# Altium footprint library standard-case.PcbLib: 221 footprints (part 7 of 14) (continued)
## 256-FBGA [mm] "pitch 1mm" (continued)
  round 0.5 on Mech1: ""(-7.9,7.9)
Top Overlay:
  circle w0.25: c-9,8.3 r0.125
  region: -7.5,8.5 -8.5,7.5 -8.5,8.5
  lines w0.2: -8.5,7.5 -7.5,8.5 ; -8.5,-8.5 -8.5,8.5 8.5,8.5 8.5,-8.5 -8.5,-8.5
Mechanical 1:
  lines w0.1: -8.525,-8.475 8.475,-8.475 8.475,8.525 -8.525,8.525 -8.525,-8.475
Mechanical 15:
  lines w0.1: -0.5,0 0.5,0 ; 0,-0.5 0,0.5 ; -9,-9 -9,9 9,9 9,-9 -9,-9
3D body "6666.STEP": height 2, standoff 0, extent -8.525,-8.475 8.475,8.525

## 448-LFBGA [mm]
pads (449):
  round 0.3 smd mask+0.05: A1(-8.4,8.4) A2(-7.6,8.4) A3(-6.8,8.4) A4(-6,8.4) A5(-5.2,8.4) A6(-4.4,8.4) A7(-3.6,8.4) A8(-2.8,8.4) A9(-2,8.4) A10(-1.2,8.4) A11(-0.4,8.4) A12(0.4,8.4) A13(1.2,8.4) A14(2,8.4) A15(2.8,8.4) A16(3.6,8.4) A17(4.4,8.4) A18(5.2,8.4) A19(6,8.4) A20(6.8,8.4) A21(7.6,8.4) A22(8.4,8.4) AA1(-8.4,-7.6) AA2(-7.6,-7.6) AA3(-6.8,-7.6) AA4(-6,-7.6) AA5(-5.2,-7.6) AA6(-4.4,-7.6) AA7(-3.6,-7.6) AA8(-2.8,-7.6) AA9(-2,-7.6) AA10(-1.2,-7.6) AA11(-0.4,-7.6) AA12(0.4,-7.6) AA13(1.2,-7.6) AA14(2,-7.6) AA15(2.8,-7.6) AA16(3.6,-7.6) AA17(4.4,-7.6) AA18(5.2,-7.6) AA19(6,-7.6) AA20(6.8,-7.6) AA21(7.6,-7.6) AA22(8.4,-7.6) AB1(-8.4,-8.4) AB2(-7.6,-8.4) AB3(-6.8,-8.4) AB4(-6,-8.4) AB5(-5.2,-8.4) AB6(-4.4,-8.4) AB7(-3.6,-8.4) AB8(-2.8,-8.4) AB9(-2,-8.4) AB10(-1.2,-8.4) AB11(-0.4,-8.4) AB12(0.4,-8.4) AB13(1.2,-8.4) AB14(2,-8.4) AB15(2.8,-8.4) AB16(3.6,-8.4) AB17(4.4,-8.4) AB18(5.2,-8.4) AB19(6,-8.4) AB20(6.8,-8.4) AB21(7.6,-8.4) AB22(8.4,-8.4) B1(-8.4,7.6) B2(-7.6,7.6) B3(-6.8,7.6) B4(-6,7.6) B5(-5.2,7.6) B6(-4.4,7.6) B7(-3.6,7.6) B8(-2.8,7.6) B9(-2,7.6) B10(-1.2,7.6) B11(-0.4,7.6) B12(0.4,7.6) B13(1.2,7.6) B14(2,7.6) B15(2.8,7.6) B16(3.6,7.6) B17(4.4,7.6) B18(5.2,7.6) B19(6,7.6) B20(6.8,7.6) B21(7.6,7.6) B22(8.4,7.6) C1(-8.4,6.8) C2(-7.6,6.8) C3(-6.8,6.8) C4(-6,6.8) C5(-5.2,6.8) C6(-4.4,6.8) C7(-3.6,6.8) C8(-2.8,6.8) C9(-2,6.8) C10(-1.2,6.8) C11(-0.4,6.8) C12(0.4,6.8) C13(1.2,6.8) C14(2,6.8) C15(2.8,6.8) C16(3.6,6.8) C17(4.4,6.8) C18(5.2,6.8) C19(6,6.8) C20(6.8,6.8) C21(7.6,6.8) C22(8.4,6.8) D1(-8.4,6) D2(-7.6,6) D3(-6.8,6) D4(-6,6) D5(-5.2,6) D6(-4.4,6) D7(-3.6,6) D8(-2.8,6) D9(-2,6) D10(-1.2,6) D11(-0.4,6) D12(0.4,6) D13(1.2,6) D14(2,6) D15(2.8,6) D16(3.6,6) D17(4.4,6) D18(5.2,6) D19(6,6) D20(6.8,6) D21(7.6,6) D22(8.4,6) E1(-8.4,5.2) E2(-7.6,5.2) E3(-6.8,5.2) E4(-6,5.2) E5(-5.2,5.2) E6(-4.4,5.2) E7(-3.6,5.2) E8(-2.8,5.2) E9(-2,5.2) E10(-1.2,5.2) E11(-0.4,5.2) E12(0.4,5.2) E13(1.2,5.2) E14(2,5.2) E15(2.8,5.2) E16(3.6,5.2) E17(4.4,5.2) E18(5.2,5.2) E19(6,5.2) E20(6.8,5.2) E21(7.6,5.2) E22(8.4,5.2) F1(-8.4,4.4) F2(-7.6,4.4) F3(-6.8,4.4) F4(-6,4.4) F5(-5.2,4.4) F6(-4.4,4.4) F7(-3.6,4.4) F8(-2.8,4.4) F9(-2,4.4) F10(-1.2,4.4) F11(-0.4,4.4) F12(0.4,4.4) F13(1.2,4.4) F14(2,4.4) F15(2.8,4.4) F16(3.6,4.4) F17(4.4,4.4) F18(5.2,4.4) F19(6,4.4) F20(6.8,4.4) F21(7.6,4.4) G1(-8.4,3.6) G2(-7.6,3.6) G3(-6.8,3.6) G4(-6,3.6) G5(-5.2,3.6) G6(-4.4,3.6) G8(-2.8,3.6) G10(-1.2,3.6) G12(0.4,3.6) G14(2,3.6) G16(3.6,3.6) G17(4.4,3.6) G18(5.2,3.6) G19(6,3.6) G20(6.8,3.6) G21(7.6,3.6) G22(8.4,3.6) H1(-8.4,2.8) H2(-7.6,2.8) H3(-6.8,2.8) H4(-6,2.8) H5(-5.2,2.8) H6(-4.4,2.8) H7(-3.6,2.8) H9(-2,2.8) H11(-0.4,2.8) H13(1.2,2.8) H15(2.8,2.8) H17(4.4,2.8) H18(5.2,2.8) H19(6,2.8) H20(6.8,2.8) H21(7.6,2.8) H22(8.4,2.8) J1(-8.4,2) J2(-7.6,2) J3(-6.8,2) J4(-6,2) J5(-5.2,2) J6(-4.4,2) J8(-2.8,2) J9(-2,2) J10(-1.2,2) J11(-0.4,2) J12(0.4,2) J13(1.2,2) J14(2,2) J16(3.6,2) J17(4.4,2) J18(5.2,2) J19(6,2) J20(6.8,2) J21(7.6,2) K1(-8.4,1.2) K2(-7.6,1.2) K3(-6.8,1.2) K4(-6,1.2) K5(-5.2,1.2) K6(-4.4,1.2) K7(-3.6,1.2) K9(-2,1.2) K10(-1.2,1.2) K11(-0.4,1.2) K12(0.4,1.2) K13(1.2,1.2) K14(2,1.2) K15(2.8,1.2) K17(4.4,1.2) K18(5.2,1.2) K19(6,1.2) K20(6.8,1.2) K21(7.6,1.2) K22(8.4,1.2) L1(-8.4,0.4) L2(-7.6,0.4) L3(-6.8,0.4) L4(-6,0.4) L5(-5.2,0.4) L6(-4.4,0.4) L8(-2.8,0.4) L9(-2,0.4) L10(-1.2,0.4) L11(-0.4,0.4) L12(0.4,0.4) L13(1.2,0.4) L14(2,0.4) L16(3.6,0.4) L17(4.4,0.4) L18(5.2,0.4) L19(6,0.4) L20(6.8,0.4) L21(7.6,0.4) L22(8.4,0.4) M1(-8.4,-0.4) M2(-7.6,-0.4) M3(-6.8,-0.4) M4(-6,-0.4) M5(-5.2,-0.4) M6(-4.4,-0.4) M7(-3.6,-0.4) M9(-2,-0.4) M10(-1.2,-0.4) M11(-0.4,-0.4) M12(0.4,-0.4) M13(1.2,-0.4) M14(2,-0.4) M15(2.8,-0.4) M17(4.4,-0.4) M18(5.2,-0.4) M19(6,-0.4) M20(6.8,-0.4) M21(7.6,-0.4) M22(8.4,-0.4) N1(-8.4,-1.2) N2(-7.6,-1.2) N3(-6.8,-1.2) N4(-6,-1.2) N5(-5.2,-1.2) N6(-4.4,-1.2) N8(-2.8,-1.2) N9(-2,-1.2) N10(-1.2,-1.2) N11(-0.4,-1.2) N12(0.4,-1.2) N13(1.2,-1.2) N14(2,-1.2) N16(3.6,-1.2) N17(4.4,-1.2) N18(5.2,-1.2) N19(6,-1.2) N20(6.8,-1.2) N21(7.6,-1.2) N22(8.4,-1.2) P1(-8.4,-2) P2(-7.6,-2) P3(-6.8,-2) P4(-6,-2) P5(-5.2,-2) P6(-4.4,-2) P7(-3.6,-2) P9(-2,-2) P10(-1.2,-2) P11(-0.4,-2) P12(0.4,-2) P13(1.2,-2) P14(2,-2) P15(2.8,-2) P17(4.4,-2) P18(5.2,-2) P19(6,-2) P20(6.8,-2) P21(7.6,-2) R1(-8.4,-2.8) R2(-7.6,-2.8) R3(-6.8,-2.8) R4(-6,-2.8) R5(-5.2,-2.8) R6(-4.4,-2.8) R8(-2.8,-2.8) R10(-1.2,-2.8) R12(0.4,-2.8) R14(2,-2.8) R16(3.6,-2.8) R17(4.4,-2.8) R18(5.2,-2.8) R19(6,-2.8) R20(6.8,-2.8) R21(7.6,-2.8) R22(8.4,-2.8) T1(-8.4,-3.6) T2(-7.6,-3.6) T3(-6.8,-3.6) T4(-6,-3.6) T5(-5.2,-3.6) T6(-4.4,-3.6) T7(-3.6,-3.6) T9(-2,-3.6) T11(-0.4,-3.6) T13(1.2,-3.6) T15(2.8,-3.6) T17(4.4,-3.6) T18(5.2,-3.6) T19(6,-3.6) T20(6.8,-3.6) T21(7.6,-3.6) T22(8.4,-3.6) U1(-8.4,-4.4) U2(-7.6,-4.4) U3(-6.8,-4.4) U4(-6,-4.4) U5(-5.2,-4.4) U6(-4.4,-4.4) U7(-3.6,-4.4) U8(-2.8,-4.4) U9(-2,-4.4) U10(-1.2,-4.4) U11(-0.4,-4.4) U12(0.4,-4.4) U13(1.2,-4.4) U14(2,-4.4) U15(2.8,-4.4) U16(3.6,-4.4) U17(4.4,-4.4) U18(5.2,-4.4) U19(6,-4.4) U20(6.8,-4.4) U21(7.6,-4.4) V1(-8.4,-5.2) V2(-7.6,-5.2) V3(-6.8,-5.2) V4(-6,-5.2) V5(-5.2,-5.2) V6(-4.4,-5.2) V7(-3.6,-5.2) V8(-2.8,-5.2) V9(-2,-5.2) V10(-1.2,-5.2) V11(-0.4,-5.2) V12(0.4,-5.2) V13(1.2,-5.2) V14(2,-5.2) V15(2.8,-5.2) V16(3.6,-5.2) V17(4.4,-5.2) V18(5.2,-5.2) V19(6,-5.2) V20(6.8,-5.2) V21(7.6,-5.2) V22(8.4,-5.2) W1(-8.4,-6) W2(-7.6,-6) W3(-6.8,-6) W4(-6,-6) W5(-5.2,-6) W6(-4.4,-6) W7(-3.6,-6) W8(-2.8,-6) W9(-2,-6) W10(-1.2,-6) W11(-0.4,-6) W12(0.4,-6) W13(1.2,-6) W14(2,-6) W15(2.8,-6) W16(3.6,-6) W17(4.4,-6) W18(5.2,-6) W19(6,-6) W20(6.8,-6) W21(7.6,-6) W22(8.4,-6) Y1(-8.4,-6.8) Y2(-7.6,-6.8) Y3(-6.8,-6.8) Y4(-6,-6.8) Y5(-5.2,-6.8) Y6(-4.4,-6.8) Y7(-3.6,-6.8) Y8(-2.8,-6.8) Y9(-2,-6.8) Y10(-1.2,-6.8) Y11(-0.4,-6.8) Y12(0.4,-6.8) Y13(1.2,-6.8) Y14(2,-6.8) Y15(2.8,-6.8) Y16(3.6,-6.8) Y17(4.4,-6.8) Y18(5.2,-6.8) Y19(6,-6.8) Y20(6.8,-6.8) Y21(7.6,-6.8) Y22(8.4,-6.8)
  round 0.5 on Top Overlay: ""(-9.5,8.8)
Top Overlay:
  region: -9,8.3 -8.9,8.3 -8.2,9 -9,9
  lines w0.2: -9,-9 9,-9 9,9 -9,9 -9,-9
Mechanical 1:
  region: -9,8.2 -8.2,9 -9,9
  lines w0.1: -9,-9 9,-9 9,9 -9,9 -9,-9
Mechanical 15:
  lines w0.1: -0.4,0 0.4,0 ; 0,-0.4 0,0.4 ; -9,-9 9,-9 9,9 -9,9 -9,-9
3D body "LFBGA448.STEP": height 1.15, standoff 0, extent -9.004,-9.004 9.004,9.004

## 484-FBGA [mm] "pitch 1 mm"
height 2.4
pads (485):
  round 0.4 smd: A1(-10.5,10.5) A2(-9.5,10.5) A3(-8.5,10.5) A4(-7.5,10.5) A5(-6.5,10.5) A6(-5.5,10.5) A7(-4.5,10.5) A8(-3.5,10.5) A9(-2.5,10.5) A10(-1.5,10.5) A11(-0.5,10.5) A12(0.5,10.5) A13(1.5,10.5) A14(2.5,10.5) A15(3.5,10.5) A16(4.5,10.5) A17(5.5,10.5) A18(6.5,10.5) A19(7.5,10.5) A20(8.5,10.5) A21(9.5,10.5) A22(10.5,10.5) AA1(-10.5,-9.5) AA2(-9.5,-9.5) AA3(-8.5,-9.5) AA4(-7.5,-9.5) AA5(-6.5,-9.5) AA6(-5.5,-9.5) AA7(-4.5,-9.5) AA8(-3.5,-9.5) AA9(-2.5,-9.5) AA10(-1.5,-9.5) AA11(-0.5,-9.5) AA12(0.5,-9.5) AA13(1.5,-9.5) AA14(2.5,-9.5) AA15(3.5,-9.5) AA16(4.5,-9.5) AA17(5.5,-9.5) AA18(6.5,-9.5) AA19(7.5,-9.5) AA20(8.5,-9.5) AA21(9.5,-9.5) AA22(10.5,-9.5) AB1(-10.5,-10.5) AB2(-9.5,-10.5) AB3(-8.5,-10.5) AB4(-7.5,-10.5) AB5(-6.5,-10.5) AB6(-5.5,-10.5) AB7(-4.5,-10.5) AB8(-3.5,-10.5) AB9(-2.5,-10.5) AB10(-1.5,-10.5) AB11(-0.5,-10.5) AB12(0.5,-10.5) AB13(1.5,-10.5) AB14(2.5,-10.5) AB15(3.5,-10.5) AB16(4.5,-10.5) AB17(5.5,-10.5) AB18(6.5,-10.5) AB19(7.5,-10.5) AB20(8.5,-10.5) AB21(9.5,-10.5) AB22(10.5,-10.5) B1(-10.5,9.5) B2(-9.5,9.5) B3(-8.5,9.5) B4(-7.5,9.5) B5(-6.5,9.5) B6(-5.5,9.5) B7(-4.5,9.5) B8(-3.5,9.5) B9(-2.5,9.5) B10(-1.5,9.5) B11(-0.5,9.5) B12(0.5,9.5) B13(1.5,9.5) B14(2.5,9.5) B15(3.5,9.5) B16(4.5,9.5) B17(5.5,9.5) B18(6.5,9.5) B19(7.5,9.5) B20(8.5,9.5) B21(9.5,9.5) B22(10.5,9.5) C1(-10.5,8.5) C2(-9.5,8.5) C3(-8.5,8.5) C4(-7.5,8.5) C5(-6.5,8.5) C6(-5.5,8.5) C7(-4.5,8.5) C8(-3.5,8.5) C9(-2.5,8.5) C10(-1.5,8.5) C11(-0.5,8.5) C12(0.5,8.5) C13(1.5,8.5) C14(2.5,8.5) C15(3.5,8.5) C16(4.5,8.5) C17(5.5,8.5) C18(6.5,8.5) C19(7.5,8.5) C20(8.5,8.5) C21(9.5,8.5) C22(10.5,8.5) D1(-10.5,7.5) D2(-9.5,7.5) D3(-8.5,7.5) D4(-7.5,7.5) D5(-6.5,7.5) D6(-5.5,7.5) D7(-4.5,7.5) D8(-3.5,7.5) D9(-2.5,7.5) D10(-1.5,7.5) D11(-0.5,7.5) D12(0.5,7.5) D13(1.5,7.5) D14(2.5,7.5) D15(3.5,7.5) D16(4.5,7.5) D17(5.5,7.5) D18(6.5,7.5) D19(7.5,7.5) D20(8.5,7.5) D21(9.5,7.5) D22(10.5,7.5) E1(-10.5,6.5) E2(-9.5,6.5) E3(-8.5,6.5) E4(-7.5,6.5) E5(-6.5,6.5) E6(-5.5,6.5) E7(-4.5,6.5) E8(-3.5,6.5) E9(-2.5,6.5) E10(-1.5,6.5) E11(-0.5,6.5) E12(0.5,6.5) E13(1.5,6.5) E14(2.5,6.5) E15(3.5,6.5) E16(4.5,6.5) E17(5.5,6.5) E18(6.5,6.5) E19(7.5,6.5) E20(8.5,6.5) E21(9.5,6.5) E22(10.5,6.5) F1(-10.5,5.5) F2(-9.5,5.5) F3(-8.5,5.5) F4(-7.5,5.5) F5(-6.5,5.5) F6(-5.5,5.5) F7(-4.5,5.5) F8(-3.5,5.5) F9(-2.5,5.5) F10(-1.5,5.5) F11(-0.5,5.5) F12(0.5,5.5) F13(1.5,5.5) F14(2.5,5.5) F15(3.5,5.5) F16(4.5,5.5) F17(5.5,5.5) F18(6.5,5.5) F19(7.5,5.5) F20(8.5,5.5) F21(9.5,5.5) F22(10.5,5.5) G1(-10.5,4.5) G2(-9.5,4.5) G3(-8.5,4.5) G4(-7.5,4.5) G5(-6.5,4.5) G6(-5.5,4.5) G7(-4.5,4.5) G8(-3.5,4.5) G9(-2.5,4.5) G10(-1.5,4.5) G11(-0.5,4.5) G12(0.5,4.5) G13(1.5,4.5) G14(2.5,4.5) G15(3.5,4.5) G16(4.5,4.5) G17(5.5,4.5) G18(6.5,4.5) G19(7.5,4.5) G20(8.5,4.5) G21(9.5,4.5) G22(10.5,4.5) H1(-10.5,3.5) H2(-9.5,3.5) H3(-8.5,3.5) H4(-7.5,3.5) H5(-6.5,3.5) H6(-5.5,3.5) H7(-4.5,3.5) H8(-3.5,3.5) H9(-2.5,3.5) H10(-1.5,3.5) H11(-0.5,3.5) H12(0.5,3.5) H13(1.5,3.5) H14(2.5,3.5) H15(3.5,3.5) H16(4.5,3.5) H17(5.5,3.5) H18(6.5,3.5) H19(7.5,3.5) H20(8.5,3.5) H21(9.5,3.5) H22(10.5,3.5) J1(-10.5,2.5) J2(-9.5,2.5) J3(-8.5,2.5) J4(-7.5,2.5) J5(-6.5,2.5) J6(-5.5,2.5) J7(-4.5,2.5) J8(-3.5,2.5) J9(-2.5,2.5) J10(-1.5,2.5) J11(-0.5,2.5) J12(0.5,2.5) J13(1.5,2.5) J14(2.5,2.5) J15(3.5,2.5) J16(4.5,2.5) J17(5.5,2.5) J18(6.5,2.5) J19(7.5,2.5) J20(8.5,2.5) J21(9.5,2.5) J22(10.5,2.5) K1(-10.5,1.5) K2(-9.5,1.5) K3(-8.5,1.5) K4(-7.5,1.5) K5(-6.5,1.5) K6(-5.5,1.5) K7(-4.5,1.5) K8(-3.5,1.5) K9(-2.5,1.5) K10(-1.5,1.5) K11(-0.5,1.5) K12(0.5,1.5) K13(1.5,1.5) K14(2.5,1.5) K15(3.5,1.5) K16(4.5,1.5) K17(5.5,1.5) K18(6.5,1.5) K19(7.5,1.5) K20(8.5,1.5) K21(9.5,1.5) K22(10.5,1.5) L1(-10.5,0.5) L2(-9.5,0.5) L3(-8.5,0.5) L4(-7.5,0.5) L5(-6.5,0.5) L6(-5.5,0.5) L7(-4.5,0.5) L8(-3.5,0.5) L9(-2.5,0.5) L10(-1.5,0.5) L11(-0.5,0.5) L12(0.5,0.5) L13(1.5,0.5) L14(2.5,0.5) L15(3.5,0.5) L16(4.5,0.5) L17(5.5,0.5) L18(6.5,0.5) L19(7.5,0.5) L20(8.5,0.5) L21(9.5,0.5) L22(10.5,0.5) M1(-10.5,-0.5) M2(-9.5,-0.5) M3(-8.5,-0.5) M4(-7.5,-0.5) M5(-6.5,-0.5) M6(-5.5,-0.5) M7(-4.5,-0.5) M8(-3.5,-0.5) M9(-2.5,-0.5) M10(-1.5,-0.5) M11(-0.5,-0.5) M12(0.5,-0.5) M13(1.5,-0.5) M14(2.5,-0.5) M15(3.5,-0.5) M16(4.5,-0.5) M17(5.5,-0.5) M18(6.5,-0.5) M19(7.5,-0.5) M20(8.5,-0.5) M21(9.5,-0.5) M22(10.5,-0.5) N1(-10.5,-1.5) N2(-9.5,-1.5) N3(-8.5,-1.5) N4(-7.5,-1.5) N5(-6.5,-1.5) N6(-5.5,-1.5) N7(-4.5,-1.5) N8(-3.5,-1.5) N9(-2.5,-1.5) N10(-1.5,-1.5) N11(-0.5,-1.5) N12(0.5,-1.5) N13(1.5,-1.5) N14(2.5,-1.5) N15(3.5,-1.5) N16(4.5,-1.5) N17(5.5,-1.5) N18(6.5,-1.5) N19(7.5,-1.5) N20(8.5,-1.5) N21(9.5,-1.5) N22(10.5,-1.5) P1(-10.5,-2.5) P2(-9.5,-2.5) P3(-8.5,-2.5) P4(-7.5,-2.5) P5(-6.5,-2.5) P6(-5.5,-2.5) P7(-4.5,-2.5) P8(-3.5,-2.5) P9(-2.5,-2.5) P10(-1.5,-2.5) P11(-0.5,-2.5) P12(0.5,-2.5) P13(1.5,-2.5) P14(2.5,-2.5) P15(3.5,-2.5) P16(4.5,-2.5) P17(5.5,-2.5) P18(6.5,-2.5) P19(7.5,-2.5) P20(8.5,-2.5) P21(9.5,-2.5) P22(10.5,-2.5) R1(-10.5,-3.5) R2(-9.5,-3.5) R3(-8.5,-3.5) R4(-7.5,-3.5) R5(-6.5,-3.5) R6(-5.5,-3.5) R7(-4.5,-3.5) R8(-3.5,-3.5) R9(-2.5,-3.5) R10(-1.5,-3.5) R11(-0.5,-3.5) R12(0.5,-3.5) R13(1.5,-3.5) R14(2.5,-3.5) R15(3.5,-3.5) R16(4.5,-3.5) R17(5.5,-3.5) R18(6.5,-3.5) R19(7.5,-3.5) R20(8.5,-3.5) R21(9.5,-3.5) R22(10.5,-3.5) T1(-10.5,-4.5) T2(-9.5,-4.5) T3(-8.5,-4.5) T4(-7.5,-4.5) T5(-6.5,-4.5) T6(-5.5,-4.5) T7(-4.5,-4.5) T8(-3.5,-4.5) T9(-2.5,-4.5) T10(-1.5,-4.5) T11(-0.5,-4.5) T12(0.5,-4.5) T13(1.5,-4.5) T14(2.5,-4.5) T15(3.5,-4.5) T16(4.5,-4.5) T17(5.5,-4.5) T18(6.5,-4.5) T19(7.5,-4.5) T20(8.5,-4.5) T21(9.5,-4.5) T22(10.5,-4.5) U1(-10.5,-5.5) U2(-9.5,-5.5) U3(-8.5,-5.5) U4(-7.5,-5.5) U5(-6.5,-5.5) U6(-5.5,-5.5) U7(-4.5,-5.5) U8(-3.5,-5.5) U9(-2.5,-5.5) U10(-1.5,-5.5) U11(-0.5,-5.5) U12(0.5,-5.5) U13(1.5,-5.5) U14(2.5,-5.5) U15(3.5,-5.5) U16(4.5,-5.5) U17(5.5,-5.5) U18(6.5,-5.5) U19(7.5,-5.5) U20(8.5,-5.5) U21(9.5,-5.5) U22(10.5,-5.5) V1(-10.5,-6.5) V2(-9.5,-6.5) V3(-8.5,-6.5) V4(-7.5,-6.5) V5(-6.5,-6.5) V6(-5.5,-6.5) V7(-4.5,-6.5) V8(-3.5,-6.5) V9(-2.5,-6.5) V10(-1.5,-6.5) V11(-0.5,-6.5) V12(0.5,-6.5) V13(1.5,-6.5) V14(2.5,-6.5) V15(3.5,-6.5) V16(4.5,-6.5) V17(5.5,-6.5) V18(6.5,-6.5) V19(7.5,-6.5) V20(8.5,-6.5) V21(9.5,-6.5) V22(10.5,-6.5) W1(-10.5,-7.5) W2(-9.5,-7.5) W3(-8.5,-7.5) W4(-7.5,-7.5) W5(-6.5,-7.5) W6(-5.5,-7.5) W7(-4.5,-7.5) W8(-3.5,-7.5) W9(-2.5,-7.5) W10(-1.5,-7.5) W11(-0.5,-7.5) W12(0.5,-7.5) W13(1.5,-7.5) W14(2.5,-7.5) W15(3.5,-7.5) W16(4.5,-7.5) W17(5.5,-7.5) W18(6.5,-7.5) W19(7.5,-7.5) W20(8.5,-7.5) W21(9.5,-7.5) W22(10.5,-7.5) Y1(-10.5,-8.5) Y2(-9.5,-8.5) Y3(-8.5,-8.5) Y4(-7.5,-8.5) Y5(-6.5,-8.5) Y6(-5.5,-8.5) Y7(-4.5,-8.5) Y8(-3.5,-8.5) Y9(-2.5,-8.5) Y10(-1.5,-8.5) Y11(-0.5,-8.5) Y12(0.5,-8.5) Y13(1.5,-8.5) Y14(2.5,-8.5) Y15(3.5,-8.5) Y16(4.5,-8.5) Y17(5.5,-8.5) Y18(6.5,-8.5) Y19(7.5,-8.5) Y20(8.5,-8.5) Y21(9.5,-8.5) Y22(10.5,-8.5)
  round 0.5 on Mech1: ""(-10.8,10.7)
Top Overlay:
  circle w0.25: c-12,11.3 r0.125
  region: -10.5,11.5 -11.5,10.5 -11.5,11.5
  lines w0.2: -11.5,10.5 -10.5,11.5 ; -11.5,-11.5 -11.5,11.5 11.5,11.5 11.5,-11.5 -11.5,-11.5
Mechanical 1:
  lines w0.1: -11.5,-11.5 -11.5,11.5 11.5,11.5 11.5,-11.5 -11.5,-11.5
Mechanical 13:
  lines w0.1: -11.5,-11.5 -11.5,11.5 11.5,11.5 11.5,-11.5 -11.5,-11.5
Mechanical 15:
  lines w0.1: -0.5,0 0.5,0 ; 0,-0.5 0,0.5 ; -11.7,-11.7 -11.7,11.7 11.7,11.7 11.7,-11.7 -11.7,-11.7
3D body "User Library-FBG484C.STEP": height 2.19, standoff -0.02, extent -11.5,-11.5 11.5,11.5

## 624-TFBGA (21x21) [mm]
pads (626):
  round 0.4 smd: A1(-10,10) A2(-9.2,10) A3(-8.4,10) A4(-7.6,10) A5(-6.8,10) A6(-6,10) A7(-5.2,10) A8(-4.4,10) A9(-3.6,10) A10(-2.8,10) A11(-2,10) A12(-1.2,10) A13(-0.4,10) A14(0.4,10) A15(1.2,10) A16(2,10) A17(2.8,10) A18(3.6,10) A19(4.4,10) A20(5.2,10) A21(6,10) A22(6.8,10) A23(7.6,10) A24(8.4,10) A25(9.2,10) A26(10,10) AA1(-10,-6) AA2(-9.2,-6) AA3(-8.4,-6) AA4(-7.6,-6) AA5(-6.8,-6) AA6(-6,-6) AA7(-5.2,-6) AA8(-4.4,-6) AA9(-3.6,-6) AA10(-2.8,-6) AA11(-2,-6) AA12(-1.2,-6) AA13(-0.4,-6) AA14(0.4,-6) AA15(1.2,-6) AA16(2,-6) AA17(2.8,-6) AA18(3.6,-6) AA19(4.4,-6) AA20(5.2,-6) AA21(6,-6) AA22(6.8,-6) AA23(7.6,-6) AA24(8.4,-6) AA25(9.2,-6) AA26(10,-6) AB1(-10,-6.8) AB2(-9.2,-6.8) AB3(-8.4,-6.8) AB4(-7.6,-6.8) AB5(-6.8,-6.8) AB6(-6,-6.8) AB7(-5.2,-6.8) AB8(-4.4,-6.8) AB9(-3.6,-6.8) AB10(-2.8,-6.8) AB11(-2,-6.8) AB12(-1.2,-6.8) AB13(-0.4,-6.8) AB14(0.4,-6.8) AB15(1.2,-6.8) AB16(2,-6.8) AB17(2.8,-6.8) AB18(3.6,-6.8) AB19(4.4,-6.8) AB20(5.2,-6.8) AB21(6,-6.8) AB22(6.8,-6.8) AB23(7.6,-6.8) AB24(8.4,-6.8) AB25(9.2,-6.8) AB26(10,-6.8) AC1(-10,-7.6) AC2(-9.2,-7.6) AC3(-8.4,-7.6) AC4(-7.6,-7.6) AC5(-6.8,-7.6) AC6(-6,-7.6) AC7(-5.2,-7.6) AC8(-4.4,-7.6) AC9(-3.6,-7.6) AC10(-2.8,-7.6) AC11(-2,-7.6) AC12(-1.2,-7.6) AC13(-0.4,-7.6) AC14(0.4,-7.6) AC15(1.2,-7.6) AC16(2,-7.6) AC17(2.8,-7.6) AC18(3.6,-7.6) AC19(4.4,-7.6) AC20(5.2,-7.6) AC21(6,-7.6) AC22(6.8,-7.6) AC23(7.6,-7.6) AC24(8.4,-7.6) AC25(9.2,-7.6) AC26(10,-7.6) AD1(-10,-8.4) AD2(-9.2,-8.4) AD3(-8.4,-8.4) AD4(-7.6,-8.4) AD5(-6.8,-8.4) AD6(-6,-8.4) AD7(-5.2,-8.4) AD8(-4.4,-8.4) AD9(-3.6,-8.4) AD10(-2.8,-8.4) AD11(-2,-8.4) AD12(-1.2,-8.4) AD13(-0.4,-8.4) AD14(0.4,-8.4) AD15(1.2,-8.4) AD16(2,-8.4) AD17(2.8,-8.4) AD18(3.6,-8.4) AD19(4.4,-8.4) AD20(5.2,-8.4) AD21(6,-8.4) AD22(6.8,-8.4) AD23(7.6,-8.4) AD24(8.4,-8.4) AD25(9.2,-8.4) AD26(10,-8.4) AE1(-10,-9.2) AE2(-9.2,-9.2) AE3(-8.4,-9.2) AE4(-7.6,-9.2) AE5(-6.8,-9.2) AE6(-6,-9.2) AE7(-5.2,-9.2) AE8(-4.4,-9.2) AE9(-3.6,-9.2) AE10(-2.8,-9.2) AE11(-2,-9.2) AE12(-1.2,-9.2) AE13(-0.4,-9.2) AE14(0.4,-9.2) AE15(1.2,-9.2) AE16(2,-9.2) AE17(2.8,-9.2) AE18(3.6,-9.2) AE19(4.4,-9.2) AE20(5.2,-9.2) AE21(6,-9.2) AE22(6.8,-9.2) AE23(7.6,-9.2) AE24(8.4,-9.2) AE25(9.2,-9.2) AE26(10,-9.2) AF1(-10,-10) AF2(-9.2,-10) AF3(-8.4,-10) AF4(-7.6,-10) AF5(-6.8,-10) AF6(-6,-10) AF7(-5.2,-10) AF8(-4.4,-10) AF9(-3.6,-10) AF10(-2.8,-10) AF11(-2,-10) AF12(-1.2,-10) AF13(-0.4,-10) AF14(0.4,-10) AF15(1.2,-10) AF16(2,-10) AF17(2.8,-10) AF18(3.6,-10) AF19(4.4,-10) AF20(5.2,-10) AF21(6,-10) AF22(6.8,-10) AF23(7.6,-10) AF24(8.4,-10) AF25(9.2,-10) AF26(10,-10) B1(-10,9.2) B2(-9.2,9.2) B3(-8.4,9.2) B4(-7.6,9.2) B5(-6.8,9.2) B6(-6,9.2) B7(-5.2,9.2) B8(-4.4,9.2) B9(-3.6,9.2) B10(-2.8,9.2) B11(-2,9.2) B12(-1.2,9.2) B13(-0.4,9.2) B14(0.4,9.2) B15(1.2,9.2) B16(2,9.2) B17(2.8,9.2) B18(3.6,9.2) B19(4.4,9.2) B20(5.2,9.2) B21(6,9.2) B22(6.8,9.2) B23(7.6,9.2) B24(8.4,9.2) B25(9.2,9.2) B26(10,9.2) C1(-10,8.4) C2(-9.2,8.4) C3(-8.4,8.4) C4(-7.6,8.4) C5(-6.8,8.4) C6(-6,8.4) C7(-5.2,8.4) C8(-4.4,8.4) C9(-3.6,8.4) C10(-2.8,8.4) C11(-2,8.4) C12(-1.2,8.4) C13(-0.4,8.4) C14(0.4,8.4) C15(1.2,8.4) C16(2,8.4) C17(2.8,8.4) C18(3.6,8.4) C19(4.4,8.4) C20(5.2,8.4) C21(6,8.4) C22(6.8,8.4) C23(7.6,8.4) C24(8.4,8.4) C25(9.2,8.4) C26(10,8.4) D1(-10,7.6) D2(-9.2,7.6) D3(-8.4,7.6) D4(-7.6,7.6) D5(-6.8,7.6) D6(-6,7.6) D7(-5.2,7.6) D8(-4.4,7.6) D9(-3.6,7.6) D10(-2.8,7.6) D11(-2,7.6) D12(-1.2,7.6) D13(-0.4,7.6) D14(0.4,7.6) D15(1.2,7.6) D16(2,7.6) D17(2.8,7.6) D18(3.6,7.6) D19(4.4,7.6) D20(5.2,7.6) D21(6,7.6) D22(6.8,7.6) D23(7.6,7.6) D24(8.4,7.6) D25(9.2,7.6) D26(10,7.6) E1(-10,6.8) E2(-9.2,6.8) E3(-8.4,6.8) E4(-7.6,6.8) E5(-6.8,6.8) E6(-6,6.8) E7(-5.2,6.8) E8(-4.4,6.8) E9(-3.6,6.8) E10(-2.8,6.8) E11(-2,6.8) E12(-1.2,6.8) E13(-0.4,6.8) E14(0.4,6.8) E15(1.2,6.8) E16(2,6.8) E17(2.8,6.8) E18(3.6,6.8) E19(4.4,6.8) E20(5.2,6.8) E21(6,6.8) E22(6.8,6.8) E23(7.6,6.8) E24(8.4,6.8) E25(9.2,6.8) E26(10,6.8) F1(-10,6) F2(-9.2,6) F3(-8.4,6) F4(-7.6,6) F5(-6.8,6) F6(-6,6) F7(-5.2,6) F8(-4.4,6) F9(-3.6,6) F10(-2.8,6) F11(-2,6) F12(-1.2,6) F13(-0.4,6) F14(0.4,6) F15(1.2,6) F16(2,6) F17(2.8,6) F18(3.6,6) F19(4.4,6) F20(5.2,6) F21(6,6) F22(6.8,6) F23(7.6,6) F24(8.4,6) F25(9.2,6) F26(10,6) G1(-10,5.2) G2(-9.2,5.2) G3(-8.4,5.2) G4(-7.6,5.2) G5(-6.8,5.2) G6(-6,5.2) G21(6,5.2) G22(6.8,5.2) G23(7.6,5.2) G24(8.4,5.2) G25(9.2,5.2) G26(10,5.2) H1(-10,4.4) H2(-9.2,4.4) H3(-8.4,4.4) H4(-7.6,4.4) H5(-6.8,4.4) H6(-6,4.4) H8(-4.4,4.4) H9(-3.6,4.4) H10(-2.8,4.4) H11(-2,4.4) H12(-1.2,4.4) H13(-0.4,4.4) H14(0.4,4.4) H15(1.2,4.4) H16(2,4.4) H17(2.8,4.4) H18(3.6,4.4) H19(4.4,4.4) H21(6,4.4) H22(6.8,4.4) H23(7.6,4.4) H24(8.4,4.4) H25(9.2,4.4) H26(10,4.4) J1(-10,3.6) J2(-9.2,3.6) J3(-8.4,3.6) J4(-7.6,3.6) J5(-6.8,3.6) J6(-6,3.6) J8(-4.4,3.6) J9(-3.6,3.6) J10(-2.8,3.6) J11(-2,3.6) J12(-1.2,3.6) J13(-0.4,3.6) J14(0.4,3.6) J15(1.2,3.6) J16(2,3.6) J17(2.8,3.6) J18(3.6,3.6) J19(4.4,3.6) J21(6,3.6) J22(6.8,3.6) J23(7.6,3.6) J24(8.4,3.6) J25(9.2,3.6) J26(10,3.6) K1(-10,2.8) K2(-9.2,2.8) K3(-8.4,2.8) K4(-7.6,2.8) K5(-6.8,2.8) K6(-6,2.8) K8(-4.4,2.8) K9(-3.6,2.8) K10(-2.8,2.8) K11(-2,2.8) K12(-1.2,2.8) K13(-0.4,2.8) K14(0.4,2.8) K15(1.2,2.8) K16(2,2.8) K17(2.8,2.8) K18(3.6,2.8) K19(4.4,2.8) K21(6,2.8) K22(6.8,2.8) K23(7.6,2.8) K24(8.4,2.8) K25(9.2,2.8) K26(10,2.8) L1(-10,2) L2(-9.2,2) L3(-8.4,2) L4(-7.6,2) L5(-6.8,2) L6(-6,2) L8(-4.4,2) L9(-3.6,2) L10(-2.8,2) L11(-2,2) L12(-1.2,2) L13(-0.4,2) L14(0.4,2) L15(1.2,2) L16(2,2) L17(2.8,2) L18(3.6,2) L19(4.4,2) L21(6,2) L22(6.8,2) L23(7.6,2) L24(8.4,2) L25(9.2,2) L26(10,2) M1(-10,1.2) M2(-9.2,1.2) M3(-8.4,1.2) M4(-7.6,1.2) M5(-6.8,1.2) M6(-6,1.2) M8(-4.4,1.2) M9(-3.6,1.2) M10(-2.8,1.2) M11(-2,1.2) M12(-1.2,1.2) M13(-0.4,1.2) M14(0.4,1.2) M15(1.2,1.2) M16(2,1.2) M17(2.8,1.2) M18(3.6,1.2) M19(4.4,1.2) M21(6,1.2) M22(6.8,1.2) M23(7.6,1.2) M24(8.4,1.2) M25(9.2,1.2) M26(10,1.2) N1(-10,0.4) N2(-9.2,0.4) N3(-8.4,0.4) N4(-7.6,0.4) N5(-6.8,0.4) N6(-6,0.4) N8(-4.4,0.4) N9(-3.6,0.4) N10(-2.8,0.4) N11(-2,0.4) N12(-1.2,0.4) N13(-0.4,0.4) N14(0.4,0.4) N15(1.2,0.4) N16(2,0.4) N17(2.8,0.4) N18(3.6,0.4) N19(4.4,0.4) N21(6,0.4) N22(6.8,0.4) N23(7.6,0.4) N24(8.4,0.4) N25(9.2,0.4) N26(10,0.4) P1(-10,-0.4) P2(-9.2,-0.4) P3(-8.4,-0.4) P4(-7.6,-0.4) P5(-6.8,-0.4) P6(-6,-0.4) P8(-4.4,-0.4) P9(-3.6,-0.4) P10(-2.8,-0.4) P11(-2,-0.4) P12(-1.2,-0.4) P13(-0.4,-0.4) P14(0.4,-0.4) P15(1.2,-0.4) P16(2,-0.4) P17(2.8,-0.4) P18(3.6,-0.4) P19(4.4,-0.4) P21(6,-0.4) P22(6.8,-0.4) P23(7.6,-0.4) P24(8.4,-0.4) P25(9.2,-0.4) P26(10,-0.4) R1(-10,-1.2) R2(-9.2,-1.2) R3(-8.4,-1.2) R4(-7.6,-1.2) R5(-6.8,-1.2) R6(-6,-1.2) R8(-4.4,-1.2) R9(-3.6,-1.2) R10(-2.8,-1.2) R11(-2,-1.2) R12(-1.2,-1.2) R13(-0.4,-1.2) R14(0.4,-1.2) R15(1.2,-1.2) R16(2,-1.2) R17(2.8,-1.2) R18(3.6,-1.2) R19(4.4,-1.2) R21(6,-1.2) R22(6.8,-1.2) R23(7.6,-1.2) R24(8.4,-1.2) R25(9.2,-1.2) R26(10,-1.2) T1(-10,-2) T2(-9.2,-2) T3(-8.4,-2) T4(-7.6,-2) T5(-6.8,-2) T6(-6,-2) T8(-4.4,-2) T9(-3.6,-2) T10(-2.8,-2) T11(-2,-2) T12(-1.2,-2) T13(-0.4,-2) T14(0.4,-2) T15(1.2,-2) T16(2,-2) T17(2.8,-2) T18(3.6,-2) T19(4.4,-2) T21(6,-2) T22(6.8,-2) T23(7.6,-2) T24(8.4,-2) T25(9.2,-2) T26(10,-2) U1(-10,-2.8) U2(-9.2,-2.8) U3(-8.4,-2.8) U4(-7.6,-2.8) U5(-6.8,-2.8) U6(-6,-2.8) U8(-4.4,-2.8) U9(-3.6,-2.8) U10(-2.8,-2.8) U11(-2,-2.8) U12(-1.2,-2.8) U13(-0.4,-2.8) U14(0.4,-2.8) U15(1.2,-2.8) U16(2,-2.8) U17(2.8,-2.8) U18(3.6,-2.8) U19(4.4,-2.8) U21(6,-2.8) U22(6.8,-2.8) U23(7.6,-2.8) U24(8.4,-2.8) U25(9.2,-2.8) U26(10,-2.8) V1(-10,-3.6) V2(-9.2,-3.6) V3(-8.4,-3.6) V4(-7.6,-3.6) V5(-6.8,-3.6) V6(-6,-3.6) V8(-4.4,-3.6) V9(-3.6,-3.6) V10(-2.8,-3.6) V11(-2,-3.6) V12(-1.2,-3.6) V13(-0.4,-3.6) V14(0.4,-3.6) V15(1.2,-3.6) V16(2,-3.6) V17(2.8,-3.6) V18(3.6,-3.6) V19(4.4,-3.6) V21(6,-3.6) V22(6.8,-3.6) V23(7.6,-3.6) V24(8.4,-3.6) V25(9.2,-3.6) V26(10,-3.6) W1(-10,-4.4) W2(-9.2,-4.4) W3(-8.4,-4.4) W4(-7.6,-4.4) W5(-6.8,-4.4) W6(-6,-4.4) W8(-4.4,-4.4) W9(-3.6,-4.4) W10(-2.8,-4.4) W11(-2,-4.4) W12(-1.2,-4.4) W13(-0.4,-4.4) W14(0.4,-4.4) W15(1.2,-4.4) W16(2,-4.4) W17(2.8,-4.4) W18(3.6,-4.4) W19(4.4,-4.4) W21(6,-4.4) W22(6.8,-4.4) W23(7.6,-4.4) W24(8.4,-4.4) W25(9.2,-4.4) W26(10,-4.4) Y1(-10,-5.2) Y2(-9.2,-5.2) Y3(-8.4,-5.2) Y4(-7.6,-5.2) Y5(-6.8,-5.2) Y6(-6,-5.2) Y21(6,-5.2) Y22(6.8,-5.2) Y23(7.6,-5.2) Y24(8.4,-5.2) Y25(9.2,-5.2) Y26(10,-5.2)
  round 0.6 on Top Overlay mask+0.1: ""(-11.1,10.3)
  round 0.5 on Mech1 mask+0.1: ""(-10,10)
Top Overlay:
  lines w0.2: -10.5,-10.5 10.5,-10.5 10.5,10.5 -10.5,10.5 -10.5,-10.5
Mechanical 1:
  lines w0.1: -10.5,-10.5 10.5,-10.5 10.5,10.5 -10.5,10.5 -10.5,-10.5
Mechanical 15:
  lines w0.1: -0.5,0 0.5,0 ; 0,-0.5 0,0.5 ; -10.8,-10.8 10.8,-10.8 10.8,10.8 -10.8,10.8 -10.8,-10.8
3D body "BGA-21x21-0.8mm v0.step": height 1.36, standoff 0, extent -10.5,-10.5 10.5,10.5

## CAP: 0201 [mm]
height 0.23
pads (2):
  rect 0.3x0.3 smd mask+0.05: 1(-0.3,0) 2(0.3,0)
Top Overlay:
  lines w0.1: -0.55,-0.25 0.55,-0.25 0.55,0.25 -0.55,0.25 -0.55,-0.25
Mechanical 1:
  lines w0.1: -0.55,-0.25 0.55,-0.25 0.55,0.25 -0.55,0.25 -0.55,-0.25
Mechanical 15:
  lines w0.1: -0.15,0 0.15,0 ; 0,-0.15 0,0.15 ; -0.55,-0.25 -0.55,0.25 0.55,0.25 0.55,-0.25 -0.55,-0.25
3D body "User Library-0201(0603M) Cap.STEP": height 0.31, standoff 0, extent -0.305,-0.152 0.305,0.152

## CAP: 0402 [mm]
height 0.35
pads (2):
  rect 0.6x0.6 smd mask+0.05: 1(-0.5,0) 2(0.5,0)
Top Overlay:
  lines w0.1: -0.9,-0.4 -0.9,0.4 0.9,0.4 0.9,-0.4 -0.9,-0.4
Mechanical 1:
  lines w0.1: -0.9,-0.4 0.9,-0.4 0.9,0.4 -0.9,0.4 -0.9,-0.4
Mechanical 15:
  lines w0.1: -0.2,0 0.2,0 ; 0,-0.2 0,0.2 ; -0.9,-0.4 0.9,-0.4 0.9,0.4 -0.9,0.4 -0.9,-0.4
3D body "User Library-0402(1005M) Cap.step": height 0.51, standoff 0, extent -0.508,-0.254 0.508,0.254

## CAP: 0603 [mm]
height 0.45
pads (2):
  rect 0.85x0.85 smd: 1(-0.7,0) 2(0.7,0)
Top Overlay:
  lines w0.2: -1.325,-0.625 -1.325,0.625 1.325,0.625 1.325,-0.625 -1.325,-0.625
Mechanical 1:
  lines w0.1: -0.8,-0.4 -0.8,0.4 0.8,0.4 0.8,-0.4 -0.8,-0.4
Mechanical 15:
  lines w0.1: -0.475,0 0.475,0 ; 0,-0.475 0,0.475 ; -1.325,-0.625 1.325,-0.625 1.325,0.625 -1.325,0.625 -1.325,-0.625
3D body "SW3dPS-0603 SMD Capacitor.STEP": height 0.3, standoff 0, extent -0.8,-0.4 0.8,0.4

## CAP: 0805 [mm]
height 0.45
pads (2):
  rect 1x1.25 smd: 1(-1,0) 2(1,0)
Top Overlay:
  lines w0.2: -1.7,-0.825 1.7,-0.825 1.7,0.825 -1.7,0.825 -1.7,-0.825
Mechanical 1:
  lines w0.1: -0.949,-0.6 1.05,-0.6 1.05,0.6 -0.949,0.6 -0.949,-0.6
Mechanical 15:
  lines w0.1: -0.5,0 0.5,0 ; 0,-0.5 0,0.5 ; -1.7,-0.7 -1.7,0.7 1.7,0.7 1.7,-0.7 -1.7,-0.7
3D body "SW3dPS-0805 SMD Capacitor.STEP": height 0.78, standoff 0, extent -1,-0.625 1,0.625

## CAP: 1206 [mm]
height 0.6
pads (2):
  rect 1x1.6 smd: 1(-1.5,0) 2(1.5,0)
Top Overlay:
  lines w0.2: -2.2,-1 -2.2,1 2.2,1 2.2,-1 -2.2,-1
Mechanical 1:
  lines w0.1: -1.6,-0.775 -1.6,0.775 1.6,0.775 1.6,-0.775 -1.6,-0.775
Mechanical 15:
  lines w0.1: -0.5,0 0.5,0 ; 0,-0.5 0,0.5 ; -2.2,-1 2.2,-1 2.2,1 -2.2,1 -2.2,-1
3D body "SW3dPS-1206 SMD Capacitor.STEP": height 1, standoff 0, extent -1.6,-0.8 1.6,0.8

## CAP: 1210 [mm]
height 2.5
pads (2):
  rect 1.1x2.6 smd: 1(-1.75,0) 2(1.75,0)
Top Overlay:
  lines w0.2: -2.5,-1.5 -2.5,1.5 2.5,1.5 2.5,-1.5 -2.5,-1.5
Mechanical 1:
  lines w0.1: -2,-1.244 2,-1.244 2,1.245 -2,1.245 -2,-1.244
Mechanical 15:
  lines w0.1: -0.5,0 0.5,0 ; 0,-0.5 0,0.5 ; -2,-1.4 -2,1.4 2,1.4 2,-1.4 -2,-1.4
3D body "User Library-1210(3225M) Cap.STEP": height 1.7, standoff 0, extent -2,-1.244 2,1.245